# Altium footprint library SMD_SEMI.PcbLib: 101 footprints (part 6 of 7)
Each footprint in its own frame and in the unit in brackets; x right, y up, seen from the top. Pads: shape width x height; smd on the part's side, far side on the other; paste and mask are expansions set on the pad; w line width, h text height; cw(c..) or ccw(c..) is an arc to the next point about the centre after c.
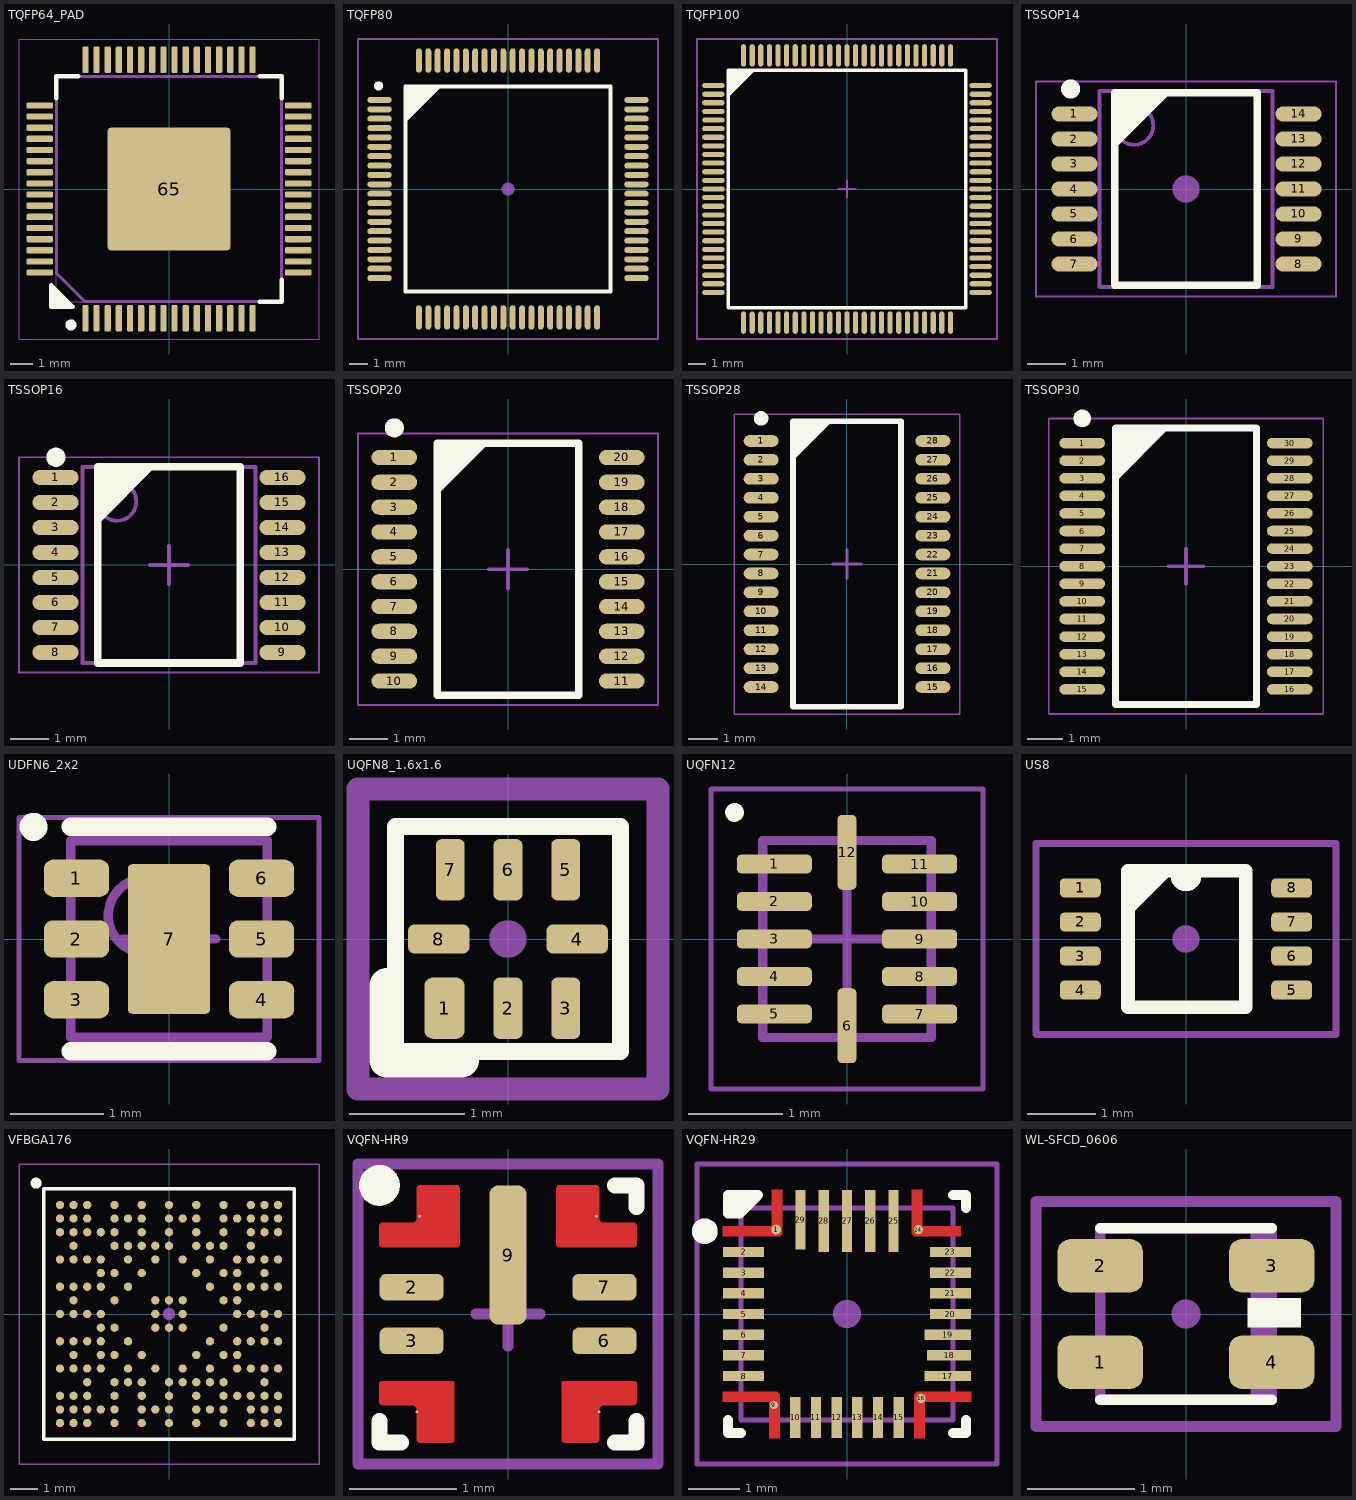
[diagram p5: the footprints below, top view; thin cyan lines are the x and y axes]

## TQFP64_PAD [mm]
height 1.2
pads (65):
  rrect50% 0.28x1.2 smd: 1(-3.75,-5.8) 2(-3.25,-5.8) 3(-2.75,-5.8) 4(-2.25,-5.8) 5(-1.75,-5.8) 6(-1.25,-5.8) 7(-0.75,-5.8) 8(-0.25,-5.8) 9(0.25,-5.8) 10(0.75,-5.8) 11(1.25,-5.8) 12(1.75,-5.8) 13(2.25,-5.8) 14(2.75,-5.8) 15(3.25,-5.8) 16(3.75,-5.8) 33(3.75,5.8) 34(3.25,5.8) 35(2.75,5.8) 36(2.25,5.8) 37(1.75,5.8) 38(1.25,5.8) 39(0.75,5.8) 40(0.25,5.8) 41(-0.25,5.8) 42(-0.75,5.8) 43(-1.25,5.8) 44(-1.75,5.8) 45(-2.25,5.8) 46(-2.75,5.8) 47(-3.25,5.8) 48(-3.75,5.8)
  rrect50% 1.2x0.28 smd: 17(5.8,-3.75) 18(5.8,-3.25) 19(5.8,-2.75) 20(5.8,-2.25) 21(5.8,-1.75) 22(5.8,-1.25) 23(5.8,-0.75) 24(5.8,-0.25) 25(5.8,0.25) 26(5.8,0.75) 27(5.8,1.25) 28(5.8,1.75) 29(5.8,2.25) 30(5.8,2.75) 31(5.8,3.25) 32(5.8,3.75) 49(-5.8,3.75) 50(-5.8,3.25) 51(-5.8,2.75) 52(-5.8,2.25) 53(-5.8,1.75) 54(-5.8,1.25) 55(-5.8,0.75) 56(-5.8,0.25) 57(-5.8,-0.25) 58(-5.8,-0.75) 59(-5.8,-1.25) 60(-5.8,-1.75) 61(-5.8,-2.25) 62(-5.8,-2.75) 63(-5.8,-3.25) 64(-5.8,-3.75)
  rrect5% 5.5x5.5 smd paste-6: 65(0,0)
Top Overlay:
  circle w0.3: c-4.4,-6.1 r0.1
  region: -5.29,-4.31 -4.31,-5.29 -5.29,-5.29
  lines w0.12: -5.29,-4.31 -5.29,-5.29 -4.31,-5.29
  lines w0.2: -5.05,4.07 -5.05,5.05 -4.07,5.05 ; 4.07,-5.05 5.05,-5.05 5.05,-4.07 ; 4.07,5.05 5.05,5.05 5.05,4.07 ; -5.29,-5.29 -4.31,-5.29 -5.29,-4.31 -5.29,-5.29
Top Paste:
  region: 2.485,-2.485 1.195,-2.485 1.195,-1.195 2.485,-1.195
  region: 2.485,-0.645 1.195,-0.645 1.195,0.645 2.485,0.645
  region: 2.485,1.195 1.195,1.195 1.195,2.485 2.485,2.485
  region: 0.645,-2.485 -0.645,-2.485 -0.645,-1.195 0.645,-1.195
  region: 0.645,-0.645 -0.645,-0.645 -0.645,0.645 0.645,0.645
  region: 0.645,1.195 -0.645,1.195 -0.645,2.485 0.645,2.485
  region: -1.195,-2.485 -2.485,-2.485 -2.485,-1.195 -1.195,-1.195
  region: -1.195,-0.645 -2.485,-0.645 -2.485,0.645 -1.195,0.645
  region: -1.195,1.195 -2.485,1.195 -2.485,2.485 -1.195,2.485
Mechanical 13:
  lines w0.001: -5.05,-5.05 -5.05,5.05 5.05,5.05 5.05,-5.05 -5.05,-5.05
  lines w0.12: -5.05,-3.78 -3.78,-5.05 5.05,-5.05 5.05,5.05 -5.05,5.05 -5.05,-3.78
Mechanical 15:
  circle w0.05: c0,0 r0.25
  lines w0.05: -0.35,0 0.35,0 ; 0,-0.35 0,0.35 ; -6.73,-6.73 -6.73,6.73 6.73,6.73 6.73,-6.73 -6.73,-6.73
3D body "User Library-IPC QFP-fullQFP50P1200X1200X120-64N MS-026ACD SU-64-2.STEP": height 1.35, standoff 0, extent -6.014,-6.014 6.014,6.014

## TQFP80 [mm]
height 3.1
pads (80):
  oval 1.3x0.32 smd: 1(-6.85,4.75) 2(-6.85,4.25) 3(-6.85,3.75) 4(-6.85,3.25) 5(-6.85,2.75) 6(-6.85,2.25) 7(-6.85,1.75) 8(-6.85,1.25) 9(-6.85,0.75) 10(-6.85,0.25) 11(-6.85,-0.25) 12(-6.85,-0.75) 13(-6.85,-1.25) 14(-6.85,-1.75) 15(-6.85,-2.25) 16(-6.85,-2.75) 17(-6.85,-3.25) 18(-6.85,-3.75) 19(-6.85,-4.25) 20(-6.85,-4.75) 41(6.85,-4.75) 42(6.85,-4.25) 43(6.85,-3.75) 44(6.85,-3.25) 45(6.85,-2.75) 46(6.85,-2.25) 47(6.85,-1.75) 48(6.85,-1.25) 49(6.85,-0.75) 50(6.85,-0.25) 51(6.85,0.25) 52(6.85,0.75) 53(6.85,1.25) 54(6.85,1.75) 55(6.85,2.25) 56(6.85,2.75) 57(6.85,3.25) 58(6.85,3.75) 59(6.85,4.25) 60(6.85,4.75)
  oval 0.32x1.3 smd: 21(-4.75,-6.85) 22(-4.25,-6.85) 23(-3.75,-6.85) 24(-3.25,-6.85) 25(-2.75,-6.85) 26(-2.25,-6.85) 27(-1.75,-6.85) 28(-1.25,-6.85) 29(-0.75,-6.85) 30(-0.25,-6.85) 31(0.25,-6.85) 32(0.75,-6.85) 33(1.25,-6.85) 34(1.75,-6.85) 35(2.25,-6.85) 36(2.75,-6.85) 37(3.25,-6.85) 38(3.75,-6.85) 39(4.25,-6.85) 40(4.75,-6.85) 61(4.75,6.85) 62(4.25,6.85) 63(3.75,6.85) 64(3.25,6.85) 65(2.75,6.85) 66(2.25,6.85) 67(1.75,6.85) 68(1.25,6.85) 69(0.75,6.85) 70(0.25,6.85) 71(-0.25,6.85) 72(-0.75,6.85) 73(-1.25,6.85) 74(-1.75,6.85) 75(-2.25,6.85) 76(-2.75,6.85) 77(-3.25,6.85) 78(-3.75,6.85) 79(-4.25,6.85) 80(-4.75,6.85)
Top Overlay:
  circle w0.254: c-6.9,5.5 r0.119
  region: -5.4,5.5 -3.6,5.5 -3.6,5.4 -5.5,3.5
  lines w0.2: -5.465,-5.465 -5.465,5.465 5.465,5.465 5.465,-5.465 -5.465,-5.465
Mechanical 15:
  circle w0.4: c0,0 r0.141
  lines w0.1: -8,-8 -8,8 8,8 8,-7.5 8,-8 -8,-8
3D body "User Library-LQFP80-2.STEP": height 1.62, standoff -0.01, extent -7.072,-7.072 7.072,7.072

## TQFP100 [mm] "TQFP-100, Thin QFP, 100-Leads, Body 14x14x1mm, Pitch 0.5mm, IPC Medium Density"
height 1
pads (100):
  oval 1.3x0.3 smd: 1(-7.75,6) 2(-7.75,5.5) 3(-7.75,5) 4(-7.75,4.5) 5(-7.75,4) 6(-7.75,3.5) 7(-7.75,3) 8(-7.75,2.5) 9(-7.75,2) 10(-7.75,1.5) 11(-7.75,1) 12(-7.75,0.5) 13(-7.75,0) 14(-7.75,-0.5) 15(-7.75,-1) 16(-7.75,-1.5) 17(-7.75,-2) 18(-7.75,-2.5) 19(-7.75,-3) 20(-7.75,-3.5) 21(-7.75,-4) 22(-7.75,-4.5) 23(-7.75,-5) 24(-7.75,-5.5) 25(-7.75,-6) 51(7.75,-6) 52(7.75,-5.5) 53(7.75,-5) 54(7.75,-4.5) 55(7.75,-4) 56(7.75,-3.5) 57(7.75,-3) 58(7.75,-2.5) 59(7.75,-2) 60(7.75,-1.5) 61(7.75,-1) 62(7.75,-0.5) 63(7.75,0) 64(7.75,0.5) 65(7.75,1) 66(7.75,1.5) 67(7.75,2) 68(7.75,2.5) 69(7.75,3) 70(7.75,3.5) 71(7.75,4) 72(7.75,4.5) 73(7.75,5) 74(7.75,5.5) 75(7.75,6)
  oval 0.3x1.3 smd: 26(-6,-7.75) 27(-5.5,-7.75) 28(-5,-7.75) 29(-4.5,-7.75) 30(-4,-7.75) 31(-3.5,-7.75) 32(-3,-7.75) 33(-2.5,-7.75) 34(-2,-7.75) 35(-1.5,-7.75) 36(-1,-7.75) 37(-0.5,-7.75) 38(0,-7.75) 39(0.5,-7.75) 40(1,-7.75) 41(1.5,-7.75) 42(2,-7.75) 43(2.5,-7.75) 44(3,-7.75) 45(3.5,-7.75) 46(4,-7.75) 47(4.5,-7.75) 48(5,-7.75) 49(5.5,-7.75) 50(6,-7.75) 76(6,7.75) 77(5.5,7.75) 78(5,7.75) 79(4.5,7.75) 80(4,7.75) 81(3.5,7.75) 82(3,7.75) 83(2.5,7.75) 84(2,7.75) 85(1.5,7.75) 86(1,7.75) 87(0.5,7.75) 88(0,7.75) 89(-0.5,7.75) 90(-1,7.75) 91(-1.5,7.75) 92(-2,7.75) 93(-2.5,7.75) 94(-3,7.75) 95(-3.5,7.75) 96(-4,7.75) 97(-4.5,7.75) 98(-5,7.75) 99(-5.5,7.75) 100(-6,7.75)
Top Overlay:
  region: -6.85,6.85 -5.35,6.85 -6.85,5.35
  lines w0.2: -6.9,-6.9 -6.9,6.9 6.9,6.9 6.9,-6.9 -6.9,-6.9
  text "." at -7.55,6.6 h0.05
Mechanical 15:
  lines w0.1: -0.5,0 0.5,0 ; 0,-0.5 0,0.5 ; -8.7,-8.7 -8.7,8.7 8.7,8.7 8.7,-8.7 -8.7,-8.7
3D body "User Library-TQFP100_Grid_0_5.STEP": height 1.2, standoff 0, extent -8,-8 8,8

## TSSOP14 [mm]
pads (14):
  oval 1.2x0.4 smd: 1(-2.912,1.95) 2(-2.912,1.3) 3(-2.912,0.65) 4(-2.912,0) 5(-2.912,-0.65) 6(-2.912,-1.3) 7(-2.912,-1.95) 8(2.913,-1.95) 9(2.913,-1.3) 10(2.913,-0.65) 11(2.913,0) 12(2.913,0.65) 13(2.913,1.3) 14(2.913,1.95)
Top Overlay:
  circle w0.25: c-3.012,2.6 r0.125
  region: -0.412,2.5 -1.912,1 -1.912,2.5 -1.862,2.55
  lines w0.2: -1.862,-2.5 -1.862,2.5 1.838,2.5 1.838,-2.5 -1.862,-2.5
Mechanical 13:
  circle w0.1: c-1.362,1.65 r0.5
  lines w0.1: -2.262,-2.55 -2.262,2.55 2.238,2.55 2.238,-2.55 -2.262,-2.55
Mechanical 15:
  circle w0.4: c-0.012,0 r0.154
  lines w0.05: -3.912,-2.8 -3.912,2.8 3.888,2.8 3.888,-2.8 -3.912,-2.8
3D body "SOP65P640X120-14N.stp": height 1.05, standoff 0, extent -3.217,-2.5 3.192,2.5

## TSSOP16 [mm] "TSOP, 16-Leads, Body 5,00x4,40mm, Pitch 0,65mm, IPC Medium Density"
height 1.2
pads (16):
  oval 1.2x0.4 smd: 1(-2.95,2.275) 2(-2.95,1.625) 3(-2.95,0.975) 4(-2.95,0.325) 5(-2.95,-0.325) 6(-2.95,-0.975) 7(-2.95,-1.625) 8(-2.95,-2.275) 9(2.95,-2.275) 10(2.95,-1.625) 11(2.95,-0.975) 12(2.95,-0.325) 13(2.95,0.325) 14(2.95,0.975) 15(2.95,1.625) 16(2.95,2.275)
Top Overlay:
  circle w0.25: c-2.941,2.8 r0.125
  region: -0.288,2.612 -1.9,1 -1.9,2.5 -1.85,2.55
  lines w0.2: -1.85,-2.55 -1.85,2.55 1.85,2.55 1.85,-2.55 -1.85,-2.55
Mechanical 13:
  circle w0.1: c-1.35,1.65 r0.5
  lines w0.1: -2.25,-2.55 -2.25,2.55 2.25,2.55 2.25,-2.55 -2.25,-2.55
Mechanical 15:
  lines w0.05: -3.9,-2.8 -3.9,2.8 3.9,2.8 3.9,-2.8 -3.9,-2.8
  lines w0.1: -0.5,0 0.5,0 ; 0,-0.5 0,0.5
3D body "TSOP65P640X120-16N.step": height 1.2, standoff 0, extent -3.2,-2.55 3.2,2.55

## TSSOP20 [mm] "TSOP, 20-Leads, Body 6.50x4.40mm, Pitch 0.65mm, IPC Medium Density"
height 1.1
pads (20):
  oval 1.2x0.4 smd: 1(-2.975,2.925) 2(-2.975,2.275) 3(-2.975,1.625) 4(-2.975,0.975) 5(-2.975,0.325) 6(-2.975,-0.325) 7(-2.975,-0.975) 8(-2.975,-1.625) 9(-2.975,-2.275) 10(-2.975,-2.925) 11(2.975,-2.925) 12(2.975,-2.275) 13(2.975,-1.625) 14(2.975,-0.975) 15(2.975,-0.325) 16(2.975,0.325) 17(2.975,0.975) 18(2.975,1.625) 19(2.975,2.275) 20(2.975,2.925)
Top Overlay:
  circle w0.25: c-2.975,3.7 r0.125
  region: -1.85,3.3 -0.5,3.3 -1.909,1.891
  lines w0.2: -1.85,-3.3 -1.85,3.3 1.85,3.3 1.85,-3.3 -1.85,-3.3
Mechanical 15:
  lines w0.05: -3.925,-3.55 3.925,-3.55 3.925,3.55 -3.925,3.55 -3.925,-3.55
  lines w0.1: -0.5,0 0.5,0 ; 0,-0.5 0,0.5
3D body "TSSOP20.step": height 1.1, standoff 0, extent -3.25,-3.3 3.25,3.3

## TSSOP28 [mm] "TSOP, 28-Leads, Body 9.70x4.40mm, Pitch 0.65mm, IPC Medium Density"
height 1.2
pads (28):
  oval 1.2x0.4 smd: 1(-2.95,4.225) 2(-2.95,3.575) 3(-2.95,2.925) 4(-2.95,2.275) 5(-2.95,1.625) 6(-2.95,0.975) 7(-2.95,0.325) 8(-2.95,-0.325) 9(-2.95,-0.975) 10(-2.95,-1.625) 11(-2.95,-2.275) 12(-2.95,-2.925) 13(-2.95,-3.575) 14(-2.95,-4.225) 15(2.95,-4.225) 16(2.95,-3.575) 17(2.95,-2.925) 18(2.95,-2.275) 19(2.95,-1.625) 20(2.95,-0.975) 21(2.95,-0.325) 22(2.95,0.325) 23(2.95,0.975) 24(2.95,1.625) 25(2.95,2.275) 26(2.95,2.925) 27(2.95,3.575) 28(2.95,4.225)
Top Overlay:
  circle w0.25: c-2.95,5 r0.125
  region: -1.85,4.9 -0.5,4.9 -1.909,3.491
  lines w0.2: -1.85,-4.9 1.85,-4.9 1.85,4.9 -1.85,4.9 -1.85,-4.9
Mechanical 15:
  lines w0.05: -3.875,-5.15 3.875,-5.15 3.875,5.15 -3.875,5.15 -3.875,-5.15
  lines w0.1: -0.5,0 0.5,0 ; 0,-0.5 0,0.5
3D body "TSSOP28.step": height 1.2, standoff 0, extent -3.2,-4.9 3.2,4.9

## TSSOP30 [mm]
height 1.2
pads (30):
  oval 1.3x0.3 smd: 1(-2.95,3.5) 2(-2.95,3) 3(-2.95,2.5) 4(-2.95,2) 5(-2.95,1.5) 6(-2.95,1) 7(-2.95,0.5) 8(-2.95,0) 9(-2.95,-0.5) 10(-2.95,-1) 11(-2.95,-1.5) 12(-2.95,-2) 13(-2.95,-2.5) 14(-2.95,-3) 15(-2.95,-3.5) 16(2.95,-3.5) 17(2.95,-3) 18(2.95,-2.5) 19(2.95,-2) 20(2.95,-1.5) 21(2.95,-1) 22(2.95,-0.5) 23(2.95,0) 24(2.95,0.5) 25(2.95,1) 26(2.95,1.5) 27(2.95,2) 28(2.95,2.5) 29(2.95,3) 30(2.95,3.5)
Top Overlay:
  circle w0.25: c-2.95,4.2 r0.125
  region: -2,3.9 -0.5,3.9 -2,2.4
  lines w0.2: -2,-3.925 -2,3.925 2,3.925 2,-3.925 -2,-3.925
Mechanical 15:
  lines w0.05: -3.9,-4.2 -3.9,4.2 3.9,4.2 3.9,-4.2 -3.9,-4.2
  lines w0.1: -0.5,0 0.5,0 ; 0,-0.5 0,0.5
3D body "TSSOP30.step": height 1.2, standoff 0, extent -3.2,-3.95 3.2,3.95

## UDFN6_2x2 [mm]
height 0.8
pads (7):
  rrect50% 0.7x0.4 smd: 1(-0.99,0.65) 2(-0.99,0) 3(-0.99,-0.65) 4(0.99,-0.65) 5(0.99,0) 6(0.99,0.65)
  rrect10% 0.88x1.6 smd: 7(0,0)
Top Overlay:
  circle w0.2: c-1.45,1.2 r0.05
  lines w0.2: -1.05,-1.2 -0.74,-1.2 ; -1.05,1.2 -0.74,1.2 ; -0.9,-1.2 1.05,-1.2 ; -0.8,1.2 1.05,1.2
Mechanical 13:
  circle w0.1: c-0.25,0.25 r0.4
  lines w0.1: -1.05,-1.05 1.05,-1.05 1.05,1.05 -1.05,1.05 -1.05,-1.05
Mechanical 15:
  lines w0.05: -1.605,-1.3 1.605,-1.3 1.605,1.3 -1.605,1.3 -1.605,-1.3
  lines w0.1: -0.5,0 0.5,0 ; 0,-0.5 0,0.5
3D body "UDFN6_2x2.step": height 0.8, standoff 0, extent -1.1,-1.05 1.1,1.05

## UQFN8_1.6x1.6 [mm]
pads (8):
  rrect40% 0.35x0.53 smd: 1(-0.55,-0.6)
  rrect40% 0.25x0.53 smd: 2(0,-0.6) 3(0.5,-0.6) 5(0.5,0.6) 6(0,0.6) 7(-0.5,0.6)
  rrect40% 0.53x0.25 smd: 4(0.6,0) 8(-0.6,0)
Top Overlay:
  lines w0.15: -0.975,-0.975 -0.975,0.975 0.975,0.975 0.975,-0.975 -0.975,-0.975
  lines w0.3: -1.05,-0.4 -1.05,-1.05 -0.4,-1.05
Mechanical 15:
  circle w0.254: c0,0 r0.035
  lines w0.2: -1.3,-1.3 1.3,-1.3 1.3,1.3 -1.3,1.3 -1.3,-1.2 -1.3,-1.3
3D body "micropack_dtype.STEP": height 0.55, standoff -0.01, extent -0.8,-0.8 0.8,0.8

## UQFN12 [mm]
height 0.55
pads (12):
  rrect50% 0.8x0.2 smd: 1(-0.775,0.8) 2(-0.775,0.4) 3(-0.775,0) 4(-0.775,-0.4) 5(-0.775,-0.8) 7(0.775,-0.8) 8(0.775,-0.4) 9(0.775,0) 10(0.775,0.4) 11(0.775,0.8)
  rrect50% 0.2x0.8 smd: 6(0,-0.925) 12(0,0.925)
Top Overlay:
  circle w0.1: c-1.2,1.35 r0.05
Mechanical 13:
  lines w0.1: -0.9,-1.05 -0.9,1.05 0.9,1.05 0.9,-1.05 -0.9,-1.05
Mechanical 15:
  lines w0.05: -1.45,-1.6 -1.45,1.6 1.45,1.6 1.45,-1.6 -1.45,-1.6
  lines w0.1: -0.5,0 0.5,0 ; 0,-0.5 0,0.5
3D body "UQFN12.step": height 0.55, standoff 0, extent -0.91,-1.06 0.91,1.06

## US8 [mm]
height 0.8
pads (8):
  rrect50% 0.6x0.28 smd: 1(-1.55,0.75) 2(-1.55,0.25) 3(-1.55,-0.25) 4(-1.55,-0.75) 5(1.55,-0.75) 6(1.55,-0.25) 7(1.55,0.25) 8(1.55,0.75)
Top Overlay:
  lines w0.2: -0.85,0.45 -0.3,1 ; -0.85,0.7 -0.55,1 ; -0.275,1 0.875,1 0.875,-1 -0.85,-1 -0.85,1 -0.125,1 ; -0.125,0.925 ccw(c0,0.925) 0.125,0.925
Mechanical 15:
  circle w0.2: c0,0 r0.1
  lines w0.1: -2.2,-1.4 -2.2,1.4 2.2,1.4 2.2,-1.4 -2.2,-1.4
3D body "User Library-US8 Package_(8US8_8SM8_8DSBGA)_2_4x2_1x0_9.SLDPRT": height 0.9, standoff 0, extent -1.6,-1.2 1.6,1.2

## VFBGA176 [mil]
height 62.99
pads (176):
  round 12 smd paste+0: A1(-157.48,157.48) A2(-137.8,157.48) A3(-118.11,157.48) A5(-78.74,157.48) A7(-39.37,157.48) A9(0,157.48) A11(39.37,157.48) A13(78.74,157.48) A15(118.11,157.48) A16(137.8,157.48) A17(157.48,157.48) B1(-157.48,137.8) B2(-137.8,137.8) B3(-118.11,137.8) B5(-78.74,137.8) B6(-59.06,137.8) B7(-39.37,137.8) B9(0,137.8) B10(19.68,137.8) B11(39.37,137.8) B13(78.74,137.8) B14(98.43,137.8) B15(118.11,137.8) B16(137.8,137.8) B17(157.48,137.8) C1(-157.48,118.11) C2(-137.8,118.11) C3(-118.11,118.11) C4(-98.43,118.11) C5(-78.74,118.11) C7(-39.37,118.11) C9(0,118.11) C11(39.37,118.11) C13(78.74,118.11) C15(118.11,118.11) C16(137.8,118.11) C17(157.48,118.11) D2(-137.8,98.43) D5(-78.74,98.43) D6(-59.06,98.43) D7(-39.37,98.43) D8(-19.68,98.43) D9(0,98.43) D11(39.37,98.43) D12(59.06,98.43) D13(78.74,98.43) D15(118.11,98.43) E1(-157.48,78.74) E2(-137.8,78.74) E3(-118.11,78.74) E4(-98.43,78.74) E6(-59.06,78.74) E8(-19.68,78.74) E10(19.68,78.74) E12(59.06,78.74) E14(98.43,78.74) E15(118.11,78.74) E16(137.8,78.74) E17(157.48,78.74) F4(-98.43,59.06) F5(-78.74,59.06) F7(-39.37,59.06) F11(39.37,59.06) F13(78.74,59.06) F14(98.43,59.06) F16(137.8,59.06) G1(-157.48,39.37) G2(-137.8,39.37) G3(-118.11,39.37) G4(-98.43,39.37) G6(-59.06,39.37) G12(59.06,39.37) G14(98.43,39.37) G15(118.11,39.37) G16(137.8,39.37) G17(157.48,39.37) H2(-137.8,19.68) H5(-78.74,19.68) H8(-19.68,19.68) H9(0,19.68) H10(19.68,19.68) H13(78.74,19.68) H14(98.43,19.68) J1(-157.48,0) J2(-137.8,0) J3(-118.11,0) J4(-98.43,0) J8(-19.68,0) J10(19.68,0) J14(98.43,0) J15(118.11,0) J16(137.8,0) J17(157.48,0) K4(-98.43,-19.68) K5(-78.74,-19.68) K8(-19.68,-19.68) K9(0,-19.68) K10(19.68,-19.68) K13(78.74,-19.68) K16(137.8,-19.68) L1(-157.48,-39.37) L2(-137.8,-39.37) L3(-118.11,-39.37) L4(-98.43,-39.37) L6(-59.06,-39.37) L12(59.06,-39.37) L14(98.43,-39.37) L15(118.11,-39.37) L16(137.8,-39.37) L17(157.48,-39.37) M2(-137.8,-59.06) M4(-98.43,-59.06) M5(-78.74,-59.06) M7(-39.37,-59.06) M11(39.37,-59.06) M13(78.74,-59.06) M14(98.43,-59.06) N1(-157.48,-78.74) N2(-137.8,-78.74) N3(-118.11,-78.74) N4(-98.43,-78.74) N6(-59.06,-78.74) N8(-19.68,-78.74) N10(19.68,-78.74) N12(59.06,-78.74) N14(98.43,-78.74) N15(118.11,-78.74) N16(137.8,-78.74) N17(157.48,-78.74) P3(-118.11,-98.43) P5(-78.74,-98.43) P6(-59.06,-98.43) P7(-39.37,-98.43) P9(0,-98.43) P10(19.68,-98.43) P11(39.37,-98.43) P12(59.06,-98.43) P13(78.74,-98.43) P16(137.8,-98.43) R1(-157.48,-118.11) R2(-137.8,-118.11) R3(-118.11,-118.11) R5(-78.74,-118.11) R7(-39.37,-118.11) R9(0,-118.11) R11(39.37,-118.11) R13(78.74,-118.11) R14(98.43,-118.11) R15(118.11,-118.11) R16(137.8,-118.11) R17(157.48,-118.11) T1(-157.48,-137.8) T2(-137.8,-137.8) T3(-118.11,-137.8) T4(-98.43,-137.8) T5(-78.74,-137.8) T7(-39.37,-137.8) T8(-19.68,-137.8) T9(0,-137.8) T11(39.37,-137.8) T12(59.06,-137.8) T13(78.74,-137.8) T15(118.11,-137.8) T16(137.8,-137.8) T17(157.48,-137.8) U1(-157.48,-157.48) U2(-137.8,-157.48) U3(-118.11,-157.48) U5(-78.74,-157.48) U7(-39.37,-157.48) U9(0,-157.48) U11(39.37,-157.48) U13(78.74,-157.48) U15(118.11,-157.48) U16(137.8,-157.48) U17(157.48,-157.48)
Top Overlay:
  circle w7.87: c-191.94,188.94 r3.94
  lines w5: -181.1,-181.1 92.52,-181.1 181.1,-181.1 181.1,92.52 181.1,181.1 -92.52,181.1 -181.1,181.1 -181.1,92.52 -181.1,-181.1
Mechanical 15:
  circle w10: c0,0 r3.94
  lines w1.97: -216.54,-216.54 216.54,-216.54 216.54,216.54 -216.54,216.54 -216.54,-216.54
3D body: height 35.43, standoff 3.94, extent -177.17,-177.17 177.17,177.17

## VQFN-HR9 [mm]
pads (9):
  round 0.025 smd mask+0.03: 1(-0.825,0.912) 4(-0.85,-0.913) 5(0.85,-0.913) 8(0.825,0.912)
  rrect50% 0.6x0.25 smd mask+0.03: 2(-0.9,0.25) 3(-0.9,-0.25) 6(0.9,-0.25) 7(0.9,0.25)
  rrect50% 0.35x1.3 smd mask+0.03: 9(0,0.55)
Top Layer:
  region: -1.175,0.625 -1.18,0.625 -1.189,0.629 -1.196,0.636 -1.2,0.645 -1.2,0.65 -1.2,0.825 -1.2,0.83 -1.196,0.839 -1.189,0.846 -1.18,0.85 -1.175,0.85 -0.9,0.85 -0.89,0.851 -0.872,0.858 -0.858,0.872 -0.851,0.89 -0.85,0.9 -0.85,1.175 -0.85,1.18 -0.846,1.189 -0.839,1.196 -0.83,1.2 -0.825,1.2 -0.475,1.2 -0.47,1.2 -0.461,1.196 -0.454,1.189 -0.45,1.18 -0.45,1.175 -0.45,0.65 -0.45,0.645 -0.454,0.636 -0.461,0.629 -0.47,0.625 -0.475,0.625
  region: -1.175,-0.626 -1.18,-0.625 -1.189,-0.629 -1.196,-0.636 -1.2,-0.645 -1.2,-0.65 -1.2,-0.651 -1.2,-0.826 -1.2,-0.83 -1.196,-0.84 -1.189,-0.847 -1.18,-0.85 -1.175,-0.85 -1.175,-0.851 -0.9,-0.851 -0.89,-0.851 -0.872,-0.859 -0.858,-0.873 -0.851,-0.891 -0.85,-0.9 -0.85,-0.901 -0.85,-1.175 -0.85,-1.18 -0.846,-1.19 -0.839,-1.197 -0.83,-1.2 -0.825,-1.2 -0.525,-1.201 -0.52,-1.201 -0.511,-1.197 -0.504,-1.19 -0.5,-1.18 -0.5,-1.176 -0.5,-0.651 -0.5,-0.646 -0.504,-0.636 -0.511,-0.629 -0.52,-0.626 -0.525,-0.626
  region: 1.175,-0.626 1.18,-0.625 1.189,-0.629 1.196,-0.636 1.2,-0.645 1.2,-0.65 1.2,-0.651 1.2,-0.826 1.2,-0.83 1.196,-0.84 1.189,-0.847 1.18,-0.85 1.175,-0.85 1.175,-0.851 0.9,-0.851 0.89,-0.851 0.872,-0.859 0.858,-0.873 0.851,-0.891 0.85,-0.9 0.85,-0.901 0.85,-1.175 0.85,-1.18 0.846,-1.19 0.839,-1.197 0.83,-1.2 0.825,-1.2 0.525,-1.201 0.52,-1.201 0.511,-1.197 0.504,-1.19 0.5,-1.18 0.5,-1.176 0.5,-0.651 0.5,-0.646 0.504,-0.636 0.511,-0.629 0.52,-0.626 0.525,-0.626
  region: 1.175,0.625 1.18,0.625 1.189,0.629 1.196,0.636 1.2,0.645 1.2,0.65 1.2,0.825 1.2,0.83 1.196,0.839 1.189,0.846 1.18,0.85 1.175,0.85 0.9,0.85 0.89,0.851 0.872,0.858 0.858,0.872 0.851,0.89 0.85,0.9 0.85,1.175 0.85,1.18 0.846,1.189 0.839,1.196 0.83,1.2 0.825,1.2 0.475,1.2 0.47,1.2 0.461,1.196 0.454,1.189 0.45,1.18 0.45,1.175 0.45,0.65 0.45,0.645 0.454,0.636 0.461,0.629 0.47,0.625 0.475,0.625
Top Overlay:
  circle w0.2: c-1.2,1.2 r0.09
  lines w0.15: -1.2,-1 -1.2,-1.2 -1,-1.2 ; 1,-1.2 1.2,-1.2 1.2,-1 ; 1,1.2 1.2,1.2 1.2,1
Mechanical 15:
  lines w0.1: -0.3,0 0.3,0 ; 0,-0.3 0,0.3 ; -1.4,-1.4 1.4,-1.4 1.4,1.4 -1.4,1.4 -1.4,-1.4
3D body: height 0.9, standoff 0, extent -1,-1 1,1

## VQFN-HR29 [mm]
pads (29):
  round 0.192 smd paste+0 mask+0: 1(-1.369,1.631)
  rect 0.8x0.2 smd paste+0 mask+0.05: 2(-2,1.2) 3(-2,0.8) 4(-2,0.4) 5(-2,0) 6(-2,-0.4) 7(-2,-0.8) 8(-2,-1.2) 20(2,0) 21(2,0.4) 22(2,0.8) 23(2,1.2)
  round 0.158 smd paste+0 mask+0: 9(-1.412,-1.763)
  rect 0.2x0.8 smd paste+0 mask+0.05: 10(-1,-2) 11(-0.6,-2) 12(-0.2,-2) 13(0.2,-2) 14(0.6,-2) 15(1,-2)
  round 0.175 smd paste+0: 16(1.431,-1.631) 24(1.381,1.631)
  rect 0.9x0.2 smd paste+0 mask+0.05: 17(1.95,-1.2) 19(1.95,-0.4)
  rect 0.85x0.2 smd paste+0 mask+0.05: 18(1.975,-0.8)
  rect 0.2x1.2 smd paste+0 mask+0.05: 25(0.9,1.8) 26(0.45,1.8) 27(0,1.8) 28(-0.45,1.8)
  rect 0.2x1.15 smd paste+0 mask+0.05: 29(-0.9,1.825)
Top Layer:
  region: 2.2,1.5 2.2,1.7 1.45,1.7 1.45,2.4 1.25,2.4 1.25,1.55 1.3,1.5
  region: 2.4,-1.5 2.4,-1.7 1.5,-1.7 1.5,-2.4 1.3,-2.4 1.3,-1.55 1.35,-1.5
  region: -2.4,-1.5 -2.4,-1.7 -1.5,-1.7 -1.5,-2.4 -1.3,-2.4 -1.3,-1.55 -1.35,-1.5
  region: -2.4,1.5 -2.4,1.7 -1.45,1.7 -1.45,2.4 -1.25,2.4 -1.25,1.55 -1.3,1.5
Top Overlay:
  circle w0.25: c-2.75,1.6 r0.125
  region: -2.3,2.3 -1.725,2.3 -2.075,1.95 -2.3,1.95
  lines w0.2: -2.3,-2.05 -2.3,-2.3 -2.05,-2.3 ; 2.05,-2.3 2.3,-2.3 2.3,-2.05 ; 2.05,2.3 2.3,2.3 2.3,2.05 ; -2.3,1.95 -2.075,1.95 -1.725,2.3 -2.3,2.3 -2.3,1.95
Mechanical 13:
  lines w0.1: -2.05,-2.05 -2.05,2.05 2.05,2.05 2.05,-2.05 -2.05,-2.05
Mechanical 15:
  circle w0.4: c0,0 r0.071
  lines w0.1: -2.9,-2.9 -2.9,2.9 2.9,2.9 2.9,-2.9 -2.9,-2.9
3D body: height 1, standoff 0, extent -2.05,-2.05 2.05,2.05

## WL-SFCD_0606 [mm] "SMD Full-color Chip LED Diffused, body 1.6x1.6mm"
height 0.4
pads (4):
  rrect50% 0.8x0.5 smd: 1(-0.8,-0.45) 2(-0.8,0.45) 3(0.8,0.45) 4(0.8,-0.45)
Top Overlay:
  rectangle: 0.575,-0.125 1.075,0.15
  lines w0.1: -0.8,-0.8 0.8,-0.8 ; -0.8,0.8 0.8,0.8
Top 3D Body:
  rectangle: 0.6,-0.8 0.8,0.8
  lines w0.1: -0.8,-0.8 0.8,-0.8 0.8,0.8 -0.8,0.8 -0.8,-0.8
Mechanical 15:
  circle w0.2: c0,0 r0.035
  lines w0.1: -1.4,-1.05 -1.4,1.05 1.4,1.05 1.4,-1.05 -1.4,-1.05
3D body "150066M153000.stp": height 0.4, standoff 0, extent -0.8,-0.8 0.8,0.8